# Altium footprint library passives_ITS_v1.PcbLib: 43 footprints (part 3 of 3)
Each footprint in its own frame and in the unit in brackets; x right, y up, seen from the top. Pads: shape width x height; smd on the part's side, far side on the other; paste and mask are expansions set on the pad; w line width, h text height; cw(c..) or ccw(c..) is an arc to the next point about the centre after c.
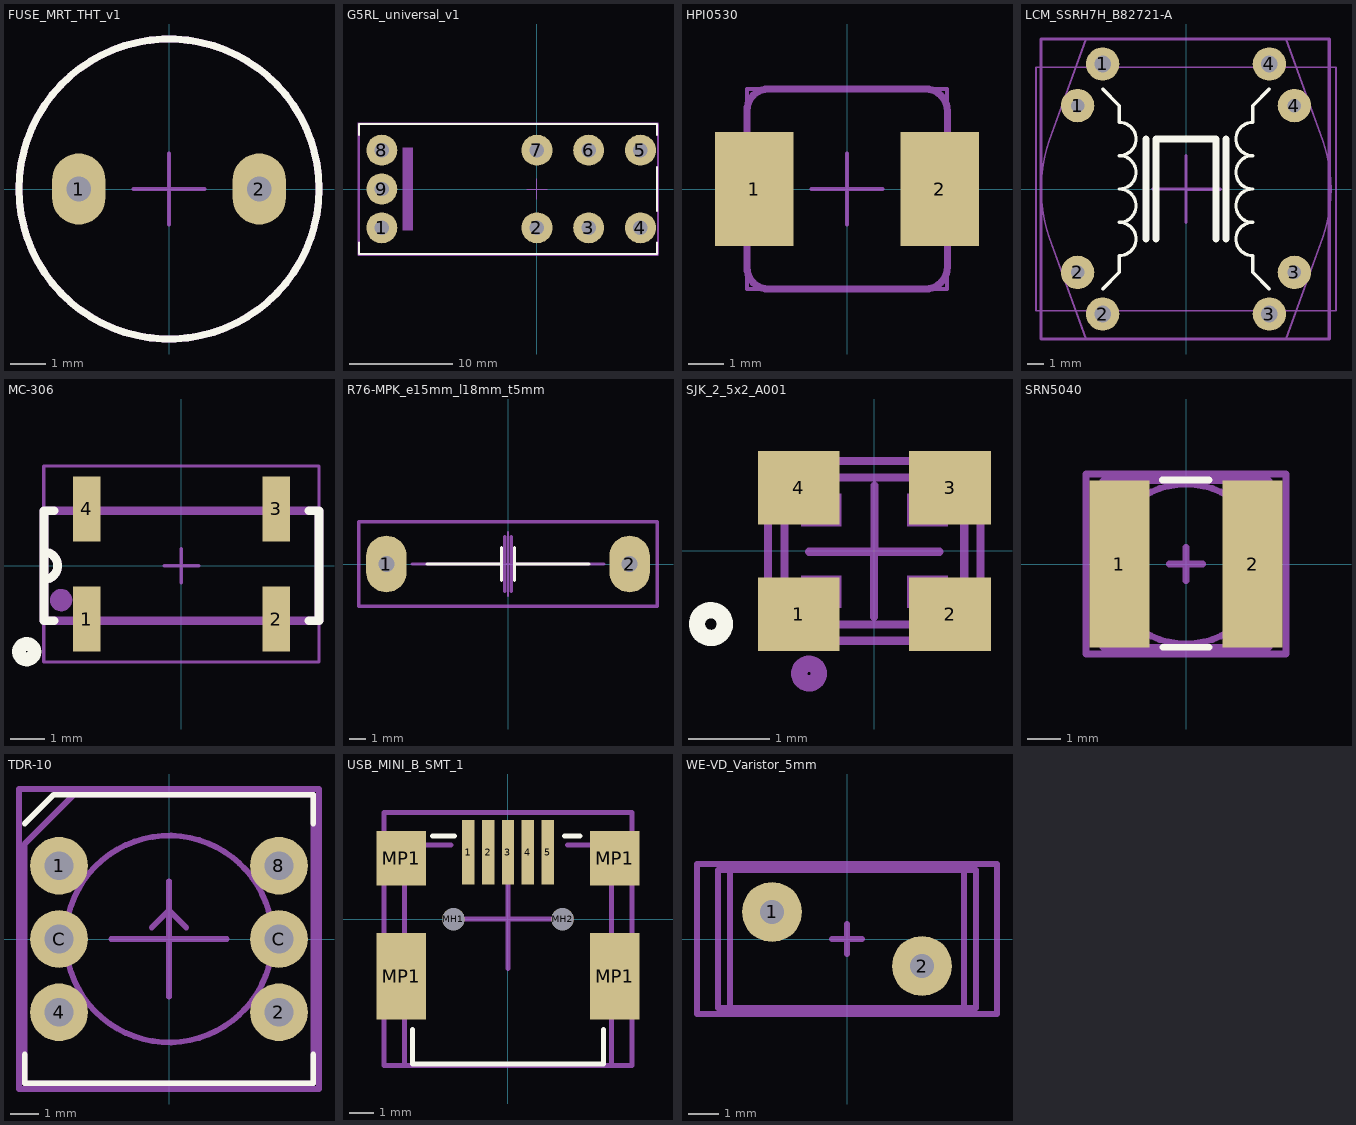
[diagram p2: the footprints below, top view; thin cyan lines are the x and y axes]

## FUSE_MRT_THT_v1 [mm] "MRT round fuse THT soldering"
pads (2):
  oval 1.5x2 hole 0.7 mask+0.1: 1(-2.54,0) 2(2.54,0)
Top Overlay:
  circle w0.2: c0,0 r4.225
M15_Orgin:
  circle w0.1: c0,0 r4.225
  lines w0.1: -1,0 0,0 ; 0,-1 0,0 ; 0,1 0,0 ; 1,0 0,0
Top M17-18_TDES:
  text "'.Designator'" at 0.417,-5.665 h1
Top M19-20_TMOT:
  circle w0.2: c0,0 r4.225
  lines w0.1: -2.892,-0.343 -2.192,-0.343 ; -2.892,-0.343 -2.892,0.357 ; -2.892,-0.343 -2.192,0.357 ; -2.892,0.357 -2.192,0.357 ; -2.892,0.357 -2.192,-0.343 ; -2.192,-0.343 -2.192,0.357 ; 2.25,-0.35 2.95,-0.35 ; 2.25,-0.35 2.25,0.35 ; 2.25,-0.35 2.95,0.35 ; 2.25,0.35 2.95,0.35 ; 2.25,0.35 2.95,-0.35 ; 2.95,-0.35 2.95,0.35
3D body "MRT_x_260001.step": height 7.91, standoff -3.16, extent -4.225,-4.225 4.225,4.225

## G5RL_universal_v1 [mm] "G5RL universal footprint"
pads (9):
  round 3 hole 1.4 paste+0 mask+0.05: 1(-15,-3.75) 2(0,-3.75) 3(5,-3.75) 4(10,-3.75) 5(10,3.75) 6(5,3.75) 7(0,3.75) 8(-15,3.75) 9(-15,0)
Top Overlay:
  lines w0.2: -17.2,-5.167 -17.2,-6.267 11.6,-6.267 11.6,-5.169 ; -17.2,5.202 -17.2,6.3 11.6,6.3 11.6,5.2 ; 11.6,-2.1 11.6,2.1
M15_Orgin:
  lines w0.1: -1,0 0,0 ; 0,-1 0,0 ; 0,1 0,0 ; 1,0 0,0 ; -17.3,-6.4 -17.3,6.4 11.7,6.4 11.7,-6.4 -10.9,-6.4 -17.3,-6.4
Top M17-18_TDES:
  text "'.Designator'" at -11.23,-0.733 h2
Top M19-20_TMOT:
  rectangle: -13,-4 -12,4
  lines w0.2: -17.2,-6.3 11.7,-6.3 11.7,6.3 -17.2,6.3 -17.2,-6.3
3D body "g5rl-k1-e.STEP": height 15.71, standoff -3.49, extent -17.3,-6.35 11.7,6.35

## HPI0530 [mm]
pads (2):
  rect 2.2x3.2 smd: 1(-2.6,0) 2(2.6,0)
Top M11-12_SMOT:
  region: -2.3,1 -3,1 -3,-1 -2.3,-1
  rectangle: 2.3,-1 3,1
  lines w0.2: -2.8,-2.2 ccw(c-2.2,-2.2) -2.2,-2.8 2.196,-2.8 ccw(c2.196,-2.187) 2.81,-2.187 2.81,2.187 ccw(c2.196,2.187) 2.196,2.8 -0.8,2.8 -2.2,2.8 ccw(c-2.2,2.2) -2.8,2.2 -2.8,-2.2
Top M13-14_SDES:
  text "'.Designator'" at -4.532,-0.333 h0.8
M15_Orgin:
  lines w0.1: -1,0 1,0 ; 0,-1 0,1 ; -2.8,-2.8 2.8,-2.8 2.8,2.8 -2.8,2.8 -2.8,-2.8
3D body: height 2, standoff 0, extent -2.9,-1.1 -2.3,1.1
3D body: height 2, standoff 0, extent 2.3,-1.1 2.9,1.1
3D body: height 3, standoff 0, extent -2.8,-2.8 2.8,2.8

## LCM_SSRH7H_B82721-A [mm]
pads (8):
  round 2 hole 0.8 mask+0.1: 1(-6.5,5) 2(-6.5,-5) 3(6.5,-5) 4(6.5,5)
  round 2 hole 1 mask+0.1: 1(-5,7.5) 2(-5,-7.5) 3(5,-7.5) 4(5,7.5)
Top Overlay:
  lines w0.2: -5,-6 -4,-5 -4,-4 ccw(c-4,-3) -4,-2 ccw(c-4,-1) -4,0 ccw(c-4,1) -4,2 ccw(c-4,3) -4,4 -4,5 -5,6 ; 5,-6 4,-5 4,-4 cw(c4,-3) 4,-2 cw(c4,-1) 4,0 cw(c4,1) 4,2 cw(c4,3) 4,4 4,5 5,6
  lines w0.4: -2.4,-3 -2.4,3 ; -1.8,-3 -1.8,3 1.8,3 1.8,-3 ; 2.4,-3 2.4,3
M15_Orgin:
  lines w0.2: -2,0 0,0 ; 0,-2 0,0 ; 0,2 0,0 ; 0.045,-0.013 2.045,-0.013 ; -8.7,-9 -8.7,9 8.6,9 8.6,-9 -8.7,-9
Top M17-18_TDES:
  text "'.Designator'" at -11.23,-0.633 h2
Top M19-20_TMOT:
  lines w0.1: -8.202,-2.9 cw(c0,0) -8.202,2.901 ; -8.202,-2.9 -6,-9 6,-9 8.2,-2.9 ; -8.2,2.9 -6,9 6,9 8.202,2.9 ; 8.202,-2.901 ccw(c0,0) 8.202,2.9 ; -9,-7.3 -0.3,-7.3 9,-7.3 9,7.3 -9,7.3 -9,-7.3
3D body "Epcos_B82721A.step": height 12.62, standoff -3.19, extent -8.65,-8.95 8.65,8.95
3D body "SSRH7H-M04596.step": height 12.01, standoff -3.49, extent -9,-7.201 9,7.3

## MC-306 [mm]
pads (4):
  rect 0.8x1.9 smd: 1(-2.75,-1.55) 2(2.75,-1.55) 3(2.75,1.65) 4(-2.75,1.65)
Top Overlay:
  circle w0.4: c-4.5,-2.5 r0.224
  lines w0.254: -4,-0.4 ccw(c-4,0) -4,0.4 ; -3.7,-1.6 -4,-1.6 -4,1.6 -3.7,1.6 ; 3.7,-1.6 4,-1.6 4,1.6 3.7,1.6
Top M11-12_SMOT:
  circle w0.35: c-3.5,-1 r0.15
  rectangle: 2.4,1 3.1,1.9
  region: 3.1,-1 2.4,-1 2.4,-1.9 3.1,-1.9
  rectangle: -3.1,1 -2.4,1.9
  region: -2.4,-1 -3.1,-1 -3.1,-1.9 -2.4,-1.9
  lines w0.254: -4,-0.4 ccw(c-4,0) -4,0.4 ; -4,-1.6 4,-1.6 4,1.6 -4,1.6 -4,-1.6
Top M13-14_SDES:
  text "'.Designator'" at -4.532,-0.333 h0.8
M15_Orgin:
  lines w0.1: -0.5,0 0.5,0 ; 0,-0.5 0,0.5 ; -4,-2.8 -4,2.9 4,2.9 4,-2.8 -4,-2.8
3D body "User Library-mc-306 crystal.step": height 2.54, standoff -0.03, extent -4,-1.901 4,1.901

## R76-MPK_e15mm_l18mm_t5mm [mm]
pads (2):
  oval 2.5x3.5 hole 1 paste-1: 1(-7.5,0) 2(7.5,0)
Top Overlay:
  lines w0.2: -5,0 -0.4,0 ; -0.4,-1 -0.4,1 ; 0.4,-1 0.4,1 ; 0.4,0 5,0
M15_Orgin:
  lines w0.1: -2,0 0,0 ; 0,-2 0,0 ; 0,2 0,0 ; 2,0 0,0 ; -9.2,-2.6 9.2,-2.6 9.2,2.6 -9.2,2.6 -9.2,-2.6
Top M17-18_TDES:
  text "'.Designator'" at -7.165,-2.017 h1
Top M19-20_TMOT:
  lines w0.2: -5.9,0 -0.2,0 ; -0.2,-1.7 -0.2,1.7 ; 0.2,-1.701 0.2,1.699 ; 0.2,0 5.9,0 ; -9.2,-2.6 9.2,-2.6 9.2,2.6 -9.2,2.6 -9.2,-2.6
3D body "R76TI210050H4J.step": height 11.11, standoff -2.59, extent -9.15,-2.6 9.15,2.605

## SJK_2_5x2_A001 [mm] "XTAL"
pads (4):
  rect 1x0.9 smd: 1(-0.925,-0.775) 2(0.925,-0.775) 3(0.925,0.775) 4(-0.925,0.775)
Top Overlay:
  circle w0.2: c-2,-0.895 r0.17
Top M11-12_SMOT:
  circle w0.2: c-0.8,-1.5 r0.12
  rectangle: -0.9,0.3 -0.4,0.7
  rectangle: 0.4,0.3 0.9,0.7
  rectangle: 0.4,-0.7 0.9,-0.3
  rectangle: -0.9,-0.7 -0.4,-0.3
  lines w0.1: -1.3,-0.9 cw(c-1.3,-1.1) -1.1,-1.1 1.1,-1.1 cw(c1.3,-1.1) 1.3,-0.9 1.3,0.9 cw(c1.3,1.1) 1.1,1.1 -1.1,1.1 cw(c-1.3,1.1) -1.3,0.9 -1.3,-0.9 ; -1.1,-0.7 ccw(c-0.9,-0.7) -0.9,-0.9 0.9,-0.9 ccw(c0.9,-0.7) 1.1,-0.7 1.1,0.7 ccw(c0.9,0.7) 0.9,0.9 0,0.9 -0.9,0.9 ccw(c-0.9,0.7) -1.1,0.7 -1.1,-0.7
Top M13-14_SDES:
  text "'.Designator'" at -3.399,1.75 h0.6
M15_Orgin:
  lines w0.1: -0.802,-0.009 -0.002,-0.009 ; -0.005,-0.809 -0.005,-0.009 0.795,-0.009 ; 0,0 0,0.8 ; -1.3,-1.1 1.3,-1.1 1.3,1.1 -1.3,1.1 -1.3,-1.1
3D body: height 19.25, standoff -0.25, extent -1.1,0 -1.1,0
3D body: height 0.6, standoff 0.4, extent -1.209,-1.014 1.231,1.017
3D body: height 0.4, standoff 0, extent -1.3,-1.1 1.3,1.1

## SRN5040 [mm] "BOURNS  SRN5040"
pads (2):
  rect 1.8x5 smd mask+0: 1(-2,0) 2(2,0)
Top Overlay:
  lines w0.2: -0.71,2.52 0.69,2.52 ; -0.7,-2.5 0.7,-2.5
Top M11-12_SMOT:
  circle w0.2: c0,0 r2.4
  region: -2.506,2.123 -2.8,2.123 -2.8,-2.077 -2.506,-2.077
  rectangle: 2.5,-2.1 2.8,2.1
  lines w0.2: -2.5,-2.5 -2.5,2.5 2.5,2.5 2.5,-2.5 -2.5,-2.5
Top M13-14_SDES:
  text "'.Designator'" at -4.532,-0.333 h0.8
M15_Orgin:
  lines w0.2: -0.5,0 0.5,0 ; 0,-0.5 0,0.5 ; -3,-2.7 3,-2.7 3,2.7 -3,2.7 -3,-2.7
3D body: height 19.25, standoff -0.25, extent 0,0 0,0
3D body "SRN5040_v3.STEP": height 4.01, standoff 0.01, extent -2.5,-2.5 2.5,2.5

## TDR-10 [mm] "rotary dip switch"
pads (6):
  round 2 hole 1 paste+0 mask+0.05: 1(-3.81,2.54) 2(3.81,-2.54) 4(-3.81,-2.54) 8(3.81,2.54) C(-3.81,0) C(3.81,0)
Top Overlay:
  lines w0.2: -5,-4 -5,-5 5,-5 5,-4 ; -5,4 -4,5 5,5 5,4
M15_Orgin:
  lines w0.2: -2,0 0,0 ; 0,-2 0,0 ; 0,2 0,0 ; 2,0 0,0 ; -5.2,-5.2 -5.2,5.2 5.2,5.2 5.2,-5.2 -5.2,-5.2
Top M17-18_TDES:
  text "'.Designator'" at 0.417,-5.665 h1
Top M19-20_TMOT:
  circle w0.2: c0,0 r3.585
  lines w0.2: 0,-0.9 0,1 ; 0.6,0.4 0,1 ; -0.6,0.4 -0.6,0.4 ; -0.6,0.4 0,1 ; -5,-5 -5,3.3 -3.3,5 5,5 5,-5 -5,-5
  text "9" at -1.561,1.28 h1.2
  text "8" at -1.953,0.034 h1.2
  text "7" at -1.706,-0.795 h1.2
  text "6" at -0.824,-1.75 h1.2
  text "5" at 0.4,-1.9 h1.2
  text "4" at 1.471,-1.28 h1.2
  text "3" at 1.853,-0.334 h1.2
  text "2" at 1.706,1.095 h1.2
  text "1" at 0.886,1.732 h1.2
  text "0" at 0.3,3.1 h1.2
3D body "TDR-10.STEP": height 6.61, standoff -3.79, extent -5,-5 5,5

## USB_MINI_B_SMT_1 [mm]
pads (11):
  rect 0.5x2.6 smd: 1(-1.6,2.7) 2(-0.8,2.7) 3(0,2.7) 4(0.8,2.7) 5(1.6,2.7)
  round 0.9 hole 0.9 unplated: MH1(-2.2,0) MH2(2.2,0)
  rect 2x3.5 smd: MP1(-4.3,-2.3) MP1(4.3,-2.3)
  rect 2x2.2 smd: MP1(-4.3,2.45) MP1(4.3,2.45)
Top Overlay:
  lines w0.2: -3.85,-5.85 3.85,-5.85 ; -3.85,-5.842 -3.85,-4.445 ; -3.048,3.35 -2.159,3.35 ; 2.286,3.35 2.9,3.35 ; 3.85,-5.842 3.85,-4.445
Top M11-12_SMOT:
  rectangle: -0.2,1.7 0.2,3.4
  rectangle: 1.4,1.7 1.8,3.4
  rectangle: 0.6,1.7 1,3.4
  rectangle: -1,1.7 -0.6,3.4
  rectangle: -1.8,1.7 -1.4,3.4
  lines w0.2: -4.2,-3.3 -5,-3.3 -5,-1.2 -4.2,-1.2 ; -2.3,3 -4.181,3 ; 2.4,3 4.181,3 ; -4.181,1.9 -4.181,-1.2 -4.181,-3.3 -4.181,-5.9 4.181,-5.9 4.181,-3.3 ; -4.181,1.9 -4.181,3 ; -4.181,1.9 -4.981,1.9 -4.981,3 -4.181,3 ; 4.181,-3.3 4.181,-1.2 ; 4.181,-3.3 4.981,-3.3 4.981,-1.2 4.181,-1.2 ; 4.181,-1.2 4.181,1.9 ; 4.181,1.9 4.181,3 ; 4.181,1.9 4.981,1.9 4.981,3 4.181,3
Top M13-14_SDES:
  text "'.Designator'" at -6.798,-2.4 h1.2
M15_Orgin:
  lines w0.2: -2,0 0,0 ; 0,-2 0,0 ; 0,2 0,0 ; 2,0 0,0 ; -5,-5.9 -5,4.3 2.8,4.3 5,4.3 5,-5.9 -5,-5.9
3D body: height 0, standoff -9, extent 6,-5.7 6,-5.7
3D body "675031020_usb.STEP": height 3.96, standoff -0.99, extent -4.95,-5.9 4.95,3.1
3D body "10033526-n3212mlfc_AMPHENOL_USB.STEP": height 3.96, standoff -0.94, extent -4.95,-5.9 4.95,3.425

## WE-VD_Varistor_5mm [mm] "WE-VD Disk Varistor 5mm"
pads (2):
  round 2 hole 0.8 unplated: 1(-2.5,0.9) 2(2.5,-0.9)
M15_Orgin:
  lines w0.2: -0.5,0 0,0 ; 0,-0.5 0,0 ; 0,0.5 0,0 ; 0.5,0 0,0 ; -5,-2.5 5,-2.5 5,2.5 -5,2.5 -5,-2.5
Top M17-18_TDES:
  text "'.Designator'" at -3.765,0.983 h1
Top M19-20_TMOT:
  lines w0.2: -4.3,-2.3 4.306,-2.3 ; -4.3,-2.285 -4.3,2.3 4.306,2.3 4.306,-2.285 ; -3.9,-2.285 -3.9,2.3 ; 3.906,-2.285 3.906,2.3 ; -3,0.4 -2,0.4 -2,1.4 -3,1.4 -3,0.4 ; 2,-1.4 2,-0.4 3,-0.4 3,-1.4 2,-1.4
3D body "WE-VD_5_mm_short.STEP": height 10.75, standoff -1.75, extent -3.75,-1.926 3.746,1.926